# Altium footprint library IMX6_MODULE.PcbLib: 2 footprints
Each footprint in its own frame and in the unit in brackets; x right, y up, seen from the top. Pads: shape width x height; smd on the part's side, far side on the other; paste and mask are expansions set on the pad; w line width, h text height; cw(c..) or ccw(c..) is an arc to the next point about the centre after c.
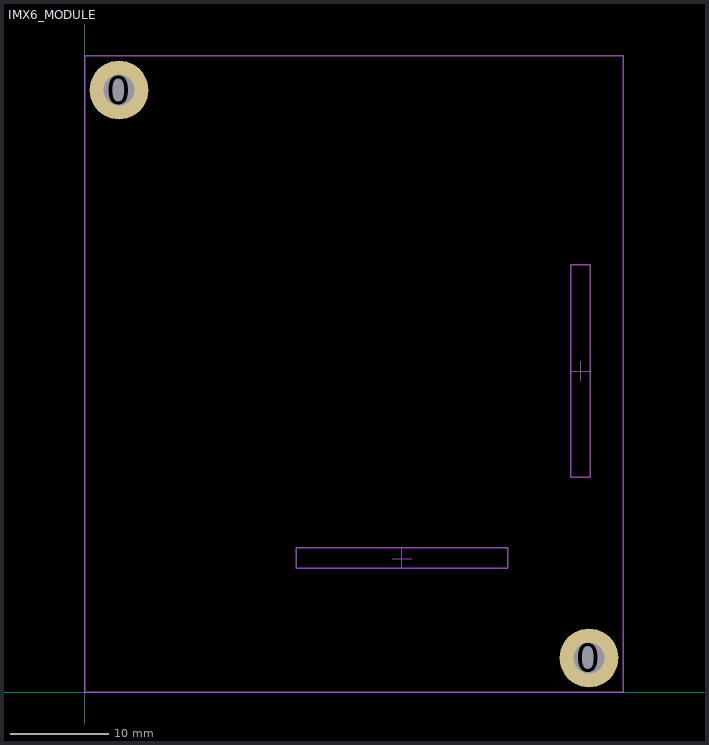
[diagram p0: the footprints below, top view; thin cyan lines are the x and y axes]

## IMX6_MODULE [mm] "IMX6_MODULE"
pads (2):
  round 6 hole 3.2: 0(3.5,61.5) 0(51.5,3.5)
Mechanical 13:
  lines w0.05: 31.4,13.645 33.4,13.645 ; 32.4,12.645 32.4,14.645 ; 49.645,32.8 51.645,32.8 ; 50.645,31.8 50.645,33.8
  lines w0.13: 0,0 55,0 55,65 0,65 0,0 ; 21.615,12.64 43.215,12.64 43.215,14.74 21.615,14.74 21.615,12.64 ; 49.615,21.94 51.615,21.94 51.615,43.64 49.615,43.64 49.615,21.94
3D body "IMX6_MODULE.step": height 10.58, standoff 1.06, extent 0,0 55,65

## PCBComponent_1 [mm]